# Altium schematic symbol library Altium_Lib.SchLib: 403 symbols (part 1 of 4) (continued)
## BT832A (continued)

## BT832X
designator U?
Bluetooth Modules (802.15.1) nRF52832 1170 Meters Bluetooth 5 Module; Manufacturer: Fanstel; Antenna: Integrated Trace; Data Rate: 1 Mb/s; Frequency: 2.4 GHz; Memory Size: 64 kB, 512 kB; Output Power: 20 dBm; Range: 1170 m; Sensitivity: - 96 dBm; Shielding: Shielded; Interface Type: I2C, SPI, UART; Class: Bluetooth Low Energy (BLE); Core: ARM Cortex M4F; Operating Supply Voltage: 1.8 V to 3.6 V; Protocol: Bluetooth 5.0; Product Status: New Product; Supplier 1: Mouser; Manufacturer Part Number: BT832X; RoHS: RoHS Compliant; Category: Bluetooth Modules (802.15.1); Stock 1: 2795; Pricing 1: 1=18.95, 10=17.50, 25=16.04, 50=15.55, 100=14.82, 250=14.09, 500=13.12, 1000=12.04 (USD); Dimensions: 15 mm x 28 mm x 1.9 mm; Height: 1.9 mm; Length: 15 mm; Packaging: Cut Tape; Series: BT832; Width: 28 mm; Brand: Fanstel; Mounting Style: SMD/SMT; Maximum Operating Temperature: + 85 C; Minimum Operating Temperature: - 40 C; Moisture Sensitive: Yes; Product Type: Bluetooth Modules; Standard Pack Qty: 1000; Subcategory: Wireless & RF Modules; Version: Bluetooth 5.0; RoHS - Mouser: Y; Minimum Order Quantity: 1; Reeling: True; ComponentLink1URL: https://www.mouser.com/datasheet/2/915/BlueNor_BT832X_datasheets-1518727.pdf; ComponentLink1Description: https://www.mouser.com/datasheet/2/915/BlueNor_BT832X_datasheets-1518727.pdf; Supplier Part Number 1: 308-BT832X
footprint BT832X
pins: 1 P26/SDA, 2 P27/SCL, 3 P00/XL1, 4 P01/XL2, 5 P02/AIN0, 6 P03/AIN1, 7 P09, 8 P10, 9 VDD, 10 GND, 11 P13, 12 P18, 13 P20, 14 P21/RESET, 15 SWCLK, 16 SWDIO, PA0 A0/VSS1, PA1 A1/P28, PA2 A2/P29, PA3 A3/P04, PA4 A4/P05, PA5 A5/P07, PB0 B0/VSS2, PB1 B1/P25, PB2 B2/P30, PB3 B3/P31, PB4 B4/P06, PB5 B5/P08, PC0 C0/VSS3, PC1 C1/P24, PC2 C2/P22, PC3 C3/P17, PC4 C4/P15, PC5 C5/P12, PD0 D0/VSS4, PD1 D1/P23, PD2 D2/P19, PD3 D3/P16, PD4 D4/P14, PD5 D5/P11

## BUZZER__AI-1223-TWT-3V-2-R
designator B?, comment AI-1223-TWT-3V-2-R
AUDIO MAGNETIC INDICATOR 2-4V TH; Manufacturer: Projects Unlimited; Frequency: 2.3kHz; Operating Supply Current: 30mA; Voltage Rating: 3V; Min Supply Voltage (DC): 2V; Max Supply Voltage (DC): 4V; Supplier 1: Avnet; Manufacturer Part Number: AI-1223-TWT-3V-2-R; Stock 1: 91; Pricing 1: 100=1.1068, 110=1.0317, 210=0.9462, 500=0.9177, 1000=0.8721, 5000=0.8493, 10000=0.7242 (USD); Mount: Through Hole; Contact Plating: Tin; Min Operating Temperature: -20°C; Max Operating Temperature: 70°C; Packaging: Tray; Termination: PC Pins; Max Supply Current: 30mA; Nominal Supply Voltage (DC): 3V; Sensing Method: Magnetic; Diameter: 12mm; Height: 7.5mm; Supplier Part Number 1: AI-1223-TWT-3V-2-R
footprint Buzzer_1
pins: 1 +, 2 -

## BUZZER__CMT-7525-80-SMT-TR
designator B?, comment CMT-7525-80-SMT-TR
BUZZER MAGN 3.6V 7.5X7.5MM SMD; Manufacturer: CUI; Supplier 1: Future Electronics; Manufacturer Part Number: CMT-7525-80-SMT-TR; Stock 1: 0; Pricing 1: 2000=0.865 (USD); Supplier Part Number 1: 4134657
footprint BUZZER_SMD__CMT-8540S-SMT-TR
pins: 1 +, 2 -

## BUZZER__CMT-8540S-SMT-TR
designator B?, comment CMT-8540S-SMT-TR
AUDIO MAGNETIC XDCR 1-6V SMD; Manufacturer: CUI Inc.; Port Location: Top; Voltage Range: 1 ~ 6V; Driver Circuitry: Transducer, Externally Driven; Frequency: 4kHz; Input Type: Zero-Peak Signal; Operating Mode: Single Tone; Sound Pressure Level (SPL): 100dB @ 5V, 10cm; Current - Supply: 150mA; Technology: Magnetic; Manufacturer Part Number: CMT-8540S-SMT-TR; RoHS: RoHS Compliant; Height - Seated (Max): 0.165" (4.20mm); Supplier: Digi-Key; Duration: -; Mounting Type: Surface Mount; Part Status: Active; Packaging: Tape & Reel (TR); Operating Temperature: -20°C ~ 70°C; Approvals: -; Category: Audio Products; Size / Dimension: 0.335" L x 0.335" W (8.50mm x 8.50mm); Ratings: -; Termination: Solder Pads; ComponentLink1URL: https://www.cui.com/product/resource/digikeypdf/cmt-8540s-smt.pdf; ComponentLink1Description: https://www.cui.com/product/resource/digikeypdf/cmt-8540s-smt.pdf; Pricing: 1000=1.9152, 3000=1.872 (USD); Supplier Part Number: 102-3746-2-ND
footprint BUZZER_SMD__CMT-8540S-SMT-TR
pins: 1 +, 2 -

## BUZZER__MCW12075-5V-2300-F
designator B?, comment MCW12075-5V-2300-F
AUDIO MAGNETIC INDICATOR 4-7V TH; Manufacturer: SUNWAY; Voltage Range: 3V - 7V; Current - Supply: 30mA; Sound Pressure Level (SPL): 85dB @ 10cm; Manufacturer Part Number: MCW12075-5V-2300-F; Technology: Magnetic
footprint Buzzer_1
pins: 1 +, 2 -

## BUZZER__ST-0503
designator LS?, comment ST-0503
5 mm, 3 V, 75 dB, Surface Mount _SMT_, Magnetic Audio Transducer Buzzer; Manufacturer: Soberton Inc.; Port Location: Top; Current - Supply: 110mA; Driver Circuitry: Transducer, Externally Driven; Input Type: Zero-Peak Signal; Voltage Range: 2 ~ 4V; Frequency: 4kHz; Operating Mode: Single Tone; Sound Pressure Level (SPL): 80dB @ 3V, 10cm; Operating Temperature: -40°C ~ 85°C; Mounting Type: Surface Mount; Ratings: -; Termination: Solder Pads; Manufacturer Part Number: ST-0503; Approvals: -; Category: Audio Products; Supplier: Digi-Key; RoHS: RoHS Compliant; Packaging: Tape & Reel (TR); Part Status: Active; Technology: Magnetic; Duration: -; Height - Seated (Max): 0.114" (2.90mm); Size / Dimension: 0.197" L x 0.197" W (5.00mm x 5.00mm); ComponentLink1URL: https://media.digikey.com/pdf/Data%20Sheets/Soberton%20PDFs/ST-0503.pdf; ComponentLink1Description: https://media.digikey.com/pdf/Data%20Sheets/Soberton%20PDFs/ST-0503.pdf; Pricing: 2500=1.08185 (GBP); Supplier Part Number: 433-1083-2-ND
footprint ST-0503
pins: 1 P, 2 N
text: +

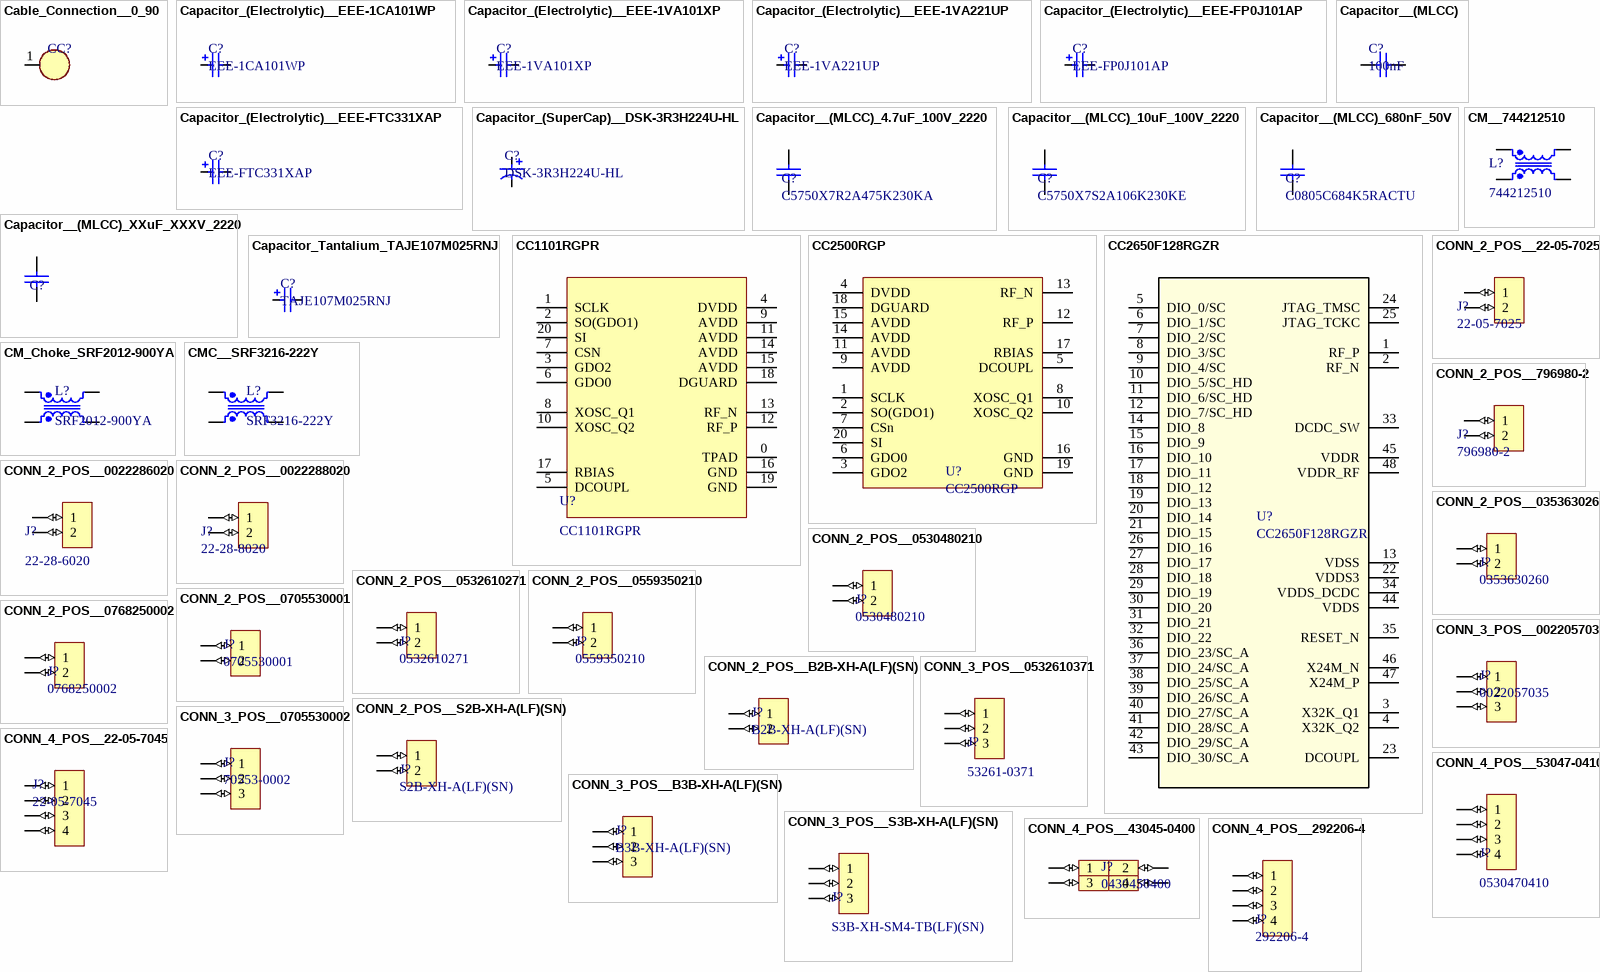
[diagram p1: symbols Cable_Connection__0_90 to CONN_4_POS__292206-4]

## Cable_Connection__0_90
designator CC?  (no BOM)
Cable Connection part
footprint Cable_Connection (0.9X1.8) ((H_0.90mmX D1.80mm)))
pins: 1 (power)

## Capacitor_(Electrolytic)__EEE-1CA101WP
designator C?, comment EEE-1CA101WP
CAP ALUM 100UF 20% 16V SMD; Manufacturer: Panasonic Electronic Components; Ripple Current - High Frequency: 119mA @ 10kHz; Lifetime @ Temp.: 1000 Hrs @ 85°C; Surface Mount Land Size: 0.260" L x 0.260" W (6.60mm x 6.60mm); Capacitance: 100µF; Ripple Current - Low Frequency: 70mA @ 120Hz; Polarization: Polar; Impedance: -; Mounting Type: Surface Mount; Part Status: Active; ESR (Equivalent Series Resistance): -; Package / Case: Radial, Can - SMD; Category: Capacitors; Lead Spacing: -; Applications: General Purpose; Voltage Rating: 16V; Tolerance: ±20%; Size / Dimension: 0.248" Dia (6.30mm); RoHS: RoHS Compliant; Packaging: Cut Tape (CT); Manufacturer Part Number: EEE-1CA101WP; Height - Seated (Max): 0.213" (5.40mm); Supplier: Digi-Key; Operating Temperature: -40°C ~ 85°C; ComponentLink1URL: https://industrial.panasonic.com/cdbs/www-data/pdf/RDE0000/ABA0000C1145.pdf; ComponentLink1Description: https://industrial.panasonic.com/cdbs/www-data/pdf/RDE0000/ABA0000C1145.pdf; Pricing: 1=0.38, 10=0.263, 100=0.1579, 500=0.11846 (USD); Supplier Part Number: PCE3880CT-ND
footprint AE_C_R6
pins: 1, 2

## Capacitor_(Electrolytic)__EEE-1VA101XP
designator C?, comment EEE-1VA101XP
CAP ALUM 100UF 20% 35V SMD; Manufacturer: Panasonic Electronic Components; Capacitance: 100µF; Ripple Current: 132mA @ 120Hz; Polarization: Polar; Lifetime @ Temp.: 2000 Hrs @ 85°C; Surface Mount Land Size: 0.260" L x 0.260" W (6.60mm x 6.60mm); Package / Case: Radial, Can - SMD; Mounting Type: Surface Mount; Manufacturer Part Number: EEE-1VA101XP; Voltage Rating: 35V; Operating Temperature: -40°C ~ 85°C; Packaging: Tape & Reel (TR); Height - Seated (Max): 0.303" (7.70mm); Supplier: Digi-Key; Applications: General Purpose; RoHS: RoHS Compliant; Tolerance: ±20%; Impedance: -; Lead Spacing: -; Size / Dimension: 0.248" Dia (6.30mm); ESR (Equivalent Series Resistance): -; Category: Capacitors; Part Status: Active; ComponentLink1URL: https://industrial.panasonic.com/cdbs/www-data/pdf/RDE0000/ABA0000C1145.pdf; ComponentLink1Description: https://industrial.panasonic.com/cdbs/www-data/pdf/RDE0000/ABA0000C1145.pdf; Pricing: 900=0.1006, 1800=0.09557, 2700=0.09054, 4500=0.08551, 9000=0.08048, 22500=0.07796, 45000=0.07545, 90000=0.07042 (USD); Stock: 45900; Supplier Part Number: PCE3951TR-ND
footprint AE_C_R6
pins: 1, 2

## Capacitor_(Electrolytic)__EEE-1VA221UP
designator C?, comment EEE-1VA221UP
CAP ALUM 220UF 20% 35V SMD; Manufacturer: Panasonic Electronic Components; Capacitance: 220µF; Lifetime @ Temp.: 2000 Hrs @ 85°C; Polarization: Polar; Surface Mount Land Size: 0.327" L x 0.327" W (8.30mm x 8.30mm); Ripple Current: 200mA @ 120Hz; Size / Dimension: 0.315" Dia (8.00mm); Packaging: Cut Tape (CT); Manufacturer Part Number: EEE-1VA221UP; RoHS: RoHS Compliant; ESR (Equivalent Series Resistance): -; Supplier: Digi-Key; Part Status: Active; Tolerance: ±20%; Operating Temperature: -40°C ~ 85°C; Impedance: -; Lead Spacing: -; Height - Seated (Max): 0.402" (10.20mm); Category: Capacitors; Voltage Rating: 35V; Package / Case: Radial, Can - SMD; Mounting Type: Surface Mount; Applications: General Purpose; ComponentLink1URL: https://industrial.panasonic.com/cdbs/www-data/pdf/RDE0000/ABA0000C1145.pdf; ComponentLink1Description: https://industrial.panasonic.com/cdbs/www-data/pdf/RDE0000/ABA0000C1145.pdf; Pricing: 1=0.57, 10=0.4, 25=0.3416, 50=0.3026, 100=0.2636, 250=0.22456 (USD); Stock: 92305; Supplier Part Number: PCE3955CT-ND
footprint AE_C_R8
pins: 1, 2

## Capacitor_(Electrolytic)__EEE-FP0J101AP
designator C?, comment EEE-FP0J101AP
CAP ALUM 100UF 20% 6.3V SMD; Manufacturer: Panasonic Electronic Components; Ripple Current - High Frequency: 300mA @ 100kHz; Lifetime @ Temp.: 2000 Hrs @ 105°C; Polarization: Polar; ESR (Equivalent Series Resistance): 260 mOhm @ 100kHz; Ripple Current - Low Frequency: 195mA @ 120Hz; Surface Mount Land Size: 0.260" L x 0.260" W (6.60mm x 6.60mm); Capacitance: 100µF; RoHS: RoHS Compliant; Lead Spacing: -; Applications: Automotive; Package / Case: Radial, Can - SMD; Part Status: Active; Manufacturer Part Number: EEE-FP0J101AP; Category: Capacitors; Supplier: Digi-Key; Packaging: Tape & Reel (TR); Height - Seated (Max): 0.228" (5.80mm); Tolerance: ±20%; Size / Dimension: 0.248" Dia (6.30mm); Mounting Type: Surface Mount; Operating Temperature: -55°C ~ 105°C; ComponentLink1URL: http://industrial.panasonic.com/www-cgi/jvcr13pz.cgi?E+PZ+3+ABA0114+EEEFP0J101AP+7+WW; ComponentLink1Description: http://industrial.panasonic.com/www-cgi/jvcr13pz.cgi?E+PZ+3+ABA0114+EEEFP0J101AP+7+WW; Pricing: 1000=0.14298, 2000=0.13457, 5000=0.12616, 10000=0.11775, 25000=0.11354, 50000=0.10934 (USD); Stock: 3000; Supplier Part Number: PCE4513TR-ND; Voltage Rating: 6.3V
footprint AE_C_R6
pins: 1, 2

## Capacitor_(Electrolytic)__EEE-FTC331XAP
designator C?, comment EEE-FTC331XAP
CAP ALUM 330UF 20% 16V SMD; Manufacturer: Panasonic Electronic Components; Surface Mount Land Size: 0.260" L x 0.260" W (6.60mm x 6.60mm); ESR (Equivalent Series Resistance): 160 mohm @ 100kHz; Polarization: Polar; Lifetime @ Temp.: 2000 Hrs @ 105°C; Capacitance: 330µF; Size / Dimension: 0.248" Dia (6.30mm); Package / Case: Radial, Can - SMD; Lead Spacing: -; Applications: Automotive; Mounting Type: Surface Mount; Ratings: AEC-Q200; Height - Seated (Max): 0.315" (8.00mm); Category: Capacitors; Supplier: Digi-Key; Packaging: Cut Tape (CT); Part Status: Active; RoHS: RoHS Compliant; Operating Temperature: -55°C ~ 105°C; Tolerance: ±20%; Manufacturer Part Number: EEE-FTC331XAP; ComponentLink1URL: https://industrial.panasonic.com/cdbs/www-data/pdf/RDE0000/ABA0000C1240.pdf; ComponentLink1Description: https://industrial.panasonic.com/cdbs/www-data/pdf/RDE0000/ABA0000C1240.pdf; Pricing: 1=0.8, 10=0.591, 100=0.4051 (USD); Supplier Part Number: P15095CT-ND
footprint CAP_6.60mmX6.60mm__8.00mm
pins: 1, 2

## Capacitor_(SuperCap)__DSK-3R3H224U-HL
designator C?, comment DSK-3R3H224U-HL
CAP 220MF -20% +80% 3.3V SMD; Manufacturer: Elna America; Lifetime @ Temp.: 1000 Hrs @ 60°C; ESR (Equivalent Series Resistance): 200 Ohm; Tolerance: -20%, +80%; Manufacturer Part Number: DSK-3R3H224U-HL; Category: Capacitors; Package / Case: Coin, Wide Terminals - Opposite Sides; Operating Temperature: -10°C ~ 60°C; Lead Spacing: -; Height - Seated (Max): 0.118" (3.00mm); Termination: SMD (SMT) Tabs; Supplier: Digi-Key; Mounting Type: Surface Mount; Size / Dimension: 0.268" Dia (6.80mm); Part Status: Active; Packaging: Tape & Reel (TR); RoHS: RoHS Compliant; ComponentLink1URL: https://media.digikey.com/pdf/Data%20Sheets/Elna%20America%20Inc/DS,DSK.pdf; ComponentLink1Description: https://media.digikey.com/pdf/Data%20Sheets/Elna%20America%20Inc/DS,DSK.pdf; Pricing: 1500=0.64815, 3000=0.60494, 4500=0.58334, 10500=0.56173, 15000=0.55093 (USD); Supplier Part Number: 604-1020-2-ND
footprint SuperCAp
pins: 1, 2

## Capacitor__(MLCC)
designator C?, comment 100nF
Manufacturer Part Number: 100nF; Category: Capacitors
footprint C-0402 (Chip Capacitor; Body 1.0 x 0.5 mm (LxW typ))
footprint C-0603 (Chip Capacitor; Body 1.6 x 0.8 mm (LxW typ))
footprint C-0805 (Chip Resistor; Body 2.0 x 1.3 mm (LxW typ))
footprint C-1206 (Chip Resistor; Body 3.2 x 1.6 mm (LxW typ))
footprint C-1210 (Chip Resistor; Body 3.2 x 2.5 mm (LxW typ))
pins: 1, 2

## Capacitor__(MLCC)_4.7uF_100V_2220
designator C?, comment C5750X7R2A475K230KA
CAP CER 4.7UF 100V X7R 2220; Manufacturer: TDK Corporation; Tolerance: ±10%; Notification: Current market demand for these product types have resulted in fluctuating and extending lead times. Lead times may differ.; Capacitance: 4.7µF; RoHS: RoHS Compliant; Manufacturer Part Number: C5750X7R2A475K230KA; Supplier: Digi-Key; Category: Capacitors; Height - Seated (Max): -; Operating Temperature: -55°C ~ 125°C; Thickness (Max): 0.098" (2.50mm); Lead Spacing: -; Temperature Coefficient: X7R; Size / Dimension: 0.224" L x 0.197" W (5.70mm x 5.00mm); Lead Style: -; Failure Rate: -; Mounting Type: Surface Mount, MLCC; Packaging: Cut Tape (CT); Ratings: -; Applications: General Purpose; Part Status: Active; Package / Case: 2220 (5750 Metric); Voltage - Rated: 100V; Features: -; ComponentLink1URL: https://product.tdk.com/info/en/catalog/datasheets/mlcc_commercial_midvoltage_en.pdf; ComponentLink1Description: https://product.tdk.com/info/en/catalog/datasheets/mlcc_commercial_midvoltage_en.pdf; Pricing: 1=2.93, 10=2.372, 100=1.8113 (USD); Supplier Part Number: 445-4526-1-ND
footprint CAPC2220(5750)165_M
pins: 1, 2

## Capacitor__(MLCC)_10uF_100V_2220
designator C?, comment C5750X7S2A106K230KE
CAP CER 10UF 100V X7S 2220; Manufacturer: TDK Corporation; Tolerance: ±10%; Capacitance: 10µF; Supplier 1: Digi-Key; Manufacturer Part Number: C5750X7S2A106K230KE; RoHS: RoHS Compliant; Category: Capacitors; Stock 1: 5000; Pricing 1: 1=3.85, 10=3.105, 100=2.4219 (USD); Packaging: Cut Tape (CT); Part Status: Active; Voltage - Rated: 100V; Temperature Coefficient: X7S; Operating Temperature: -55°C ~ 125°C; Features: Soft Termination; Ratings: -; Applications: Boardflex Sensitive; Failure Rate: -; Mounting Type: Surface Mount, MLCC; Package / Case: 2220 (5750 Metric); Size / Dimension: 0.224" L x 0.197" W (5.70mm x 5.00mm); Height - Seated (Max): -; Thickness (Max): 0.110" (2.80mm); Lead Spacing: -; Lead Style: -; ComponentLink1URL: https://product.tdk.com/info/en/catalog/datasheets/mlcc_commercial_soft_en.pdf; ComponentLink1Description: https://product.tdk.com/info/en/catalog/datasheets/mlcc_commercial_soft_en.pdf; Supplier Part Number 1: 445-8871-1-ND
footprint CAPC2220(5750)165_M
pins: 1, 2

## Capacitor__(MLCC)_680nF_50V
designator C?, comment C0805C684K5RACTU
CAP CER 0.68UF 50V X7R 0805; Manufacturer: KEMET; Notification: Current market demand for these product types have resulted in fluctuating and extending lead times. Lead times may differ.; Tolerance: ±10%; Capacitance: 0.68µF; Supplier: Digi-Key; Category: Capacitors; Ratings: -; Manufacturer Part Number: C0805C684K5RACTU; Operating Temperature: -55°C ~ 125°C; Lead Spacing: -; Lead Style: -; Part Status: Active; Mounting Type: Surface Mount, MLCC; Size / Dimension: 0.079" L x 0.049" W (2.00mm x 1.25mm); Package / Case: 0805 (2012 Metric); Thickness (Max): 0.057" (1.45mm); Temperature Coefficient: X7R; Applications: General Purpose; Features: Low ESL; RoHS: RoHS Compliant; Packaging: Cut Tape (CT); Failure Rate: -; Height - Seated (Max): -; Voltage - Rated: 50V; ComponentLink1URL: https://api.kemet.com/component-edge/download/datasheet/C0805C684K5RACTU.pdf; ComponentLink1Description: https://api.kemet.com/component-edge/download/datasheet/C0805C684K5RACTU.pdf; Pricing: 1=0.42, 10=0.29, 100=0.1642, 500=0.11592, 1000=0.10143 (USD); Supplier Part Number: 399-8114-1-ND
footprint C-0805 (Chip Resistor; Body 2.0 x 1.3 mm (LxW typ))
pins: 1, 2

## Capacitor__(MLCC)_XXuF_XXXV_2220
designator C?
Not mounted (only Footprint); Manufacturer: TDK Corporation
footprint CAPC2220(5750)165_M
pins: 1, 2

## Capacitor_Tantalium_TAJE107M025RNJ
designator C?, comment TAJE107M025RNJ
CAP TANT 100UF 25V 20% 2917; Manufacturer: AVX Corporation; Manufacturer Size Code: E; Capacitance: 100µF; ESR (Equivalent Series Resistance): 300 mOhm; Type: Molded; Category: Capacitors; Failure Rate: -; Features: General Purpose; Height - Seated (Max): 0.169" (4.30mm); Lead Spacing: -; Lifetime @ Temp.: -; Manufacturer Part Number: TAJE107M025RNJ; Mounting Type: Surface Mount; Operating Temperature: -55°C ~ 125°C; Package / Case: 2917 (7343 Metric); Packaging: Tape & Reel (TR); Part Status: Active; RoHS: RoHS Compliant; Size / Dimension: 0.287" L x 0.169" W (7.30mm x 4.30mm); Supplier: Digi-Key; Tolerance: ±20%; Voltage - Rated: 25V; ComponentLink1URL: http://datasheets.avx.com/TAJ.pdf; ComponentLink1Description: http://datasheets.avx.com/TAJ.pdf; Pricing: 400=2.3625, 800=2.12625, 1200=2.09475 (USD); Supplier Part Number: 478-5531-2-ND
footprint CAP_TANTALIUM_7343 (7.43mm X 4.43mm)
pins: 1, 2

## CC1101RGPR
designator U?
IC RF TXRX ISM<1GHZ 20VFQFN; Manufacturer: Texas Instruments; Min Supply Voltage: 1.8V; Max Supply Voltage: 3.6V; Data Rate: 600Kbps; Frequency: 915MHz; Interface: SPI; Number of Receivers: 1; Sensitivity: -116dBm; Density: 0B; Current - Receiving: 17.1mA; Current - Transmitting: 34.2mA; Max Frequency: 928MHz; Supplier 1: Digi-Key; Manufacturer Part Number: CC1101RGPR; Stock 1: 13117; Pricing 1: 1=4.07, 10=3.635, 25=3.2716, 100=2.9807, 250=2.6899, 500=2.4136, 1000=2.0356 (USD); Mount: Surface Mount; Case/Package: VQFN; Number of Pins: 20; Weight: 0.002469oz; Contact Plating: Gold; Min Operating Temperature: -40°C; Max Operating Temperature: 85°C; Packaging: Tape and Reel; Package Quantity: 3000; Number of Transmitters: 1; Length: 4.15mm; Depth: 4.15mm; REACH SVHC: No SVHC; Lead Free: Lead Free; ComponentLink1URL: http://www.ti.com/lit/pdf/swrz020?src-supplier=Digi-Key; ComponentLink1Description: http://www.ti.com/lit/pdf/swrz020?src-supplier=Digi-Key; Supplier Part Number 1: 296-35718-1-ND
footprint VFQFN-20_Exposed_Pad
pins: 0 TPAD, 1 SCLK, 2 SO(GDO1), 3 GDO2, 4 DVDD, 5 DCOUPL, 6 GDO0, 7 CSN, 8 XOSC_Q1, 9 AVDD, 10 XOSC_Q2, 11 AVDD, 12 RF_P, 13 RF_N, 14 AVDD, 15 AVDD, 16 GND, 17 RBIAS, 18 DGUARD, 19 GND, 20 SI

## CC2500RGP
designator U?
IC RF TXRX ISM>1GHZ 20-VFQFN; Manufacturer: Texas Instruments; RF Family/Standard: General ISM > 1GHZ; Modulation: 2FSK, GFSK, MSK, OOK; Frequency: 2.4GHz; Data Rate (Max): 500kBaud; Power - Output: 1dBm; Sensitivity: -104dBm; Serial Interfaces: SPI; Voltage - Supply: 1.8 V ~ 3.6 V; Current - Receiving: 13.3mA ~ 19.6mA; Current - Transmitting: 11.1mA ~ 21.5mA; Manufacturer Part Number: CC2500RGP; Category: RF/IF and RFID; Supplier: Digi-Key; RoHS: RoHS Compliant; Packaging: Tray; Part Status: Active; Type: TxRx Only; Protocol: -; Memory Size: -; Operating Temperature: -40°C ~ 85°C; Package / Case: 20-VFQFN Exposed Pad; ComponentLink1URL: http://www.ti.com/lit/ds/symlink/cc2500.pdf; ComponentLink1Description: http://www.ti.com/lit/ds/symlink/cc2500.pdf; Pricing: 1=3.33, 10=2.97, 25=2.6732, 100=2.4354, 250=2.1978, 500=1.97208, 1000=1.6632 (USD); Supplier Part Number: 296-19468-ND
footprint VFQFN-20_Exposed_Pad
pins: 1 SCLK, 2 SO(GDO1), 3 GDO2, 4 DVDD, 5 DCOUPL, 6 GDO0, 7 CSn, 8 XOSC_Q1, 9 AVDD, 10 XOSC_Q2, 11 AVDD, 12 RF_P, 13 RF_N, 14 AVDD, 15 AVDD, 16 GND, 17 RBIAS, 18 DGUARD, 19 GND, 20 SI

## CC2650F128RGZR
designator U?
IC RF TXRX+MCU 802.15.4/BT 48QFN; Manufacturer: Texas Instruments; RF Family/Standard: 802.15.4, Bluetooth; Protocol: 6LoWPAN, Bluetooth v4.1, Zigbee®; Data Rate (Max): 1Mbps; Power - Output: 5dBm; Sensitivity: -100dBm; Modulation: DSSS, O-QPSK, GFSK; Frequency: 2.4GHz; Memory Size: 128kB Flash, 28kB SRAM; Serial Interfaces: I²C, I²S, JTAG, SPI, UART; Voltage - Supply: 1.8 V ~ 3.8 V; Current - Receiving: 5.9mA ~ 6.1mA; Current - Transmitting: 6.1mA ~ 9.1mA; Manufacturer Part Number: CC2650F128RGZR; Category: RF/IF and RFID; Supplier: Digi-Key; RoHS: RoHS Compliant; Packaging: Tape & Reel (TR); Part Status: Active; Type: TxRx + MCU; Operating Temperature: -40°C ~ 85°C; Package / Case: 48-VFQFN Exposed Pad; ComponentLink1URL: http://www.ti.com/lit/ds/symlink/cc2650.pdf; ComponentLink1Description: http://www.ti.com/lit/ds/symlink/cc2650.pdf; Pricing: 2500=3.10156 (USD); Supplier Part Number: 296-44316-2-ND
footprint QFN48-(7mmX7mm) (QFN, 48-Leads, Body 7,1x7,1mm (max), Pitch 0,50mm, IPC Medium Density)
pins: 0 EGP hidden to GND, 1 RF_P, 2 RF_N, 3 X32K_Q1, 4 X32K_Q2, 5 DIO_0/SC, 6 DIO_1/SC, 7 DIO_2/SC, 8 DIO_3/SC, 9 DIO_4/SC, 10 DIO_5/SC_HD, 11 DIO_6/SC_HD, 12 DIO_7/SC_HD, 13 VDSS, 14 DIO_8, 15 DIO_9, 16 DIO_10, 17 DIO_11, 18 DIO_12, 19 DIO_13, 20 DIO_14, 21 DIO_15, 22 VDDS3, 23 DCOUPL, 24 JTAG_TMSC, 25 JTAG_TCKC, 26 DIO_16, 27 DIO_17, 28 DIO_18, 29 DIO_19, 30 DIO_20, 31 DIO_21, 32 DIO_22, 33 DCDC_SW, 34 VDDS_DCDC, 35 RESET_N, 36 DIO_23/SC_A, 37 DIO_24/SC_A, 38 DIO_25/SC_A, 39 DIO_26/SC_A, 40 DIO_27/SC_A, 41 DIO_28/SC_A, 42 DIO_29/SC_A, 43 DIO_30/SC_A, 44 VDDS, 45 VDDR, 46 X24M_N, 47 X24M_P, 48 VDDR_RF

## CM__744212510
designator L?, comment 744212510
Common Mode Filters / Chokes WE-SL1 SMD Ln Filter 2x51uH 300ohm; Manufacturer: Wurth Electronics; Core Material: Ferrite; Inductance: 51uH; Number of Lines: 2; DC Resistance (DCR): 160mR; Current Rating: 300mA; Test Frequency: 100kHz; Inductance Tolerance: 50%; Voltage Rating (DC): 80V; Impedance: 300R; Supplier 1: Digi-Key; Manufacturer Part Number: 744212510; RoHS: Yes; Category: Fixed Inductors; Pricing 1: 1=4,37000, 10=4,31200, 50=3,89500, 100=3,75600, 500=3,47800 (USD); Mount: Surface Mount; Case/Package: SMD/SMT; Number of Pins: 4; Min Operating Temperature: -40°C; Max Operating Temperature: 105°C; Package Quantity: 1000; Packaging: Tape and Reel; Current: 300mA; Max DC Current: 300mA; Termination: SMD/SMT; Series: WE-SL1; Tolerance: 50%; Length: 6.5mm; Width: 0.142inch; Height: 1.65mm; Depth: 3.6mm; REACH SVHC: No SVHC; Lead Free: Lead Free; RoHS Compliant: Yes; ComponentLink1URL: https://datasheet.ciiva.com/11800/0900766b8059564e-11800467.pdf?src-supplier=RSComponents; ComponentLink1Description: https://datasheet.ciiva.com/11800/0900766b8059564e-11800467.pdf?src-supplier=RSComponents; ComponentLink2URL: https://datasheet.ciiva.com/6048/1735560-6048484.pdf?src-supplier=Farnell; ComponentLink2Description: https://datasheet.ciiva.com/6048/1735560-6048484.pdf?src-supplier=Farnell; ComponentLink3URL: https://datasheet.ciiva.com/1130/744212510-1130407.pdf?src-supplier=Newark; ComponentLink3Description: https://datasheet.ciiva.com/1130/744212510-1130407.pdf?src-supplier=Newark; ComponentLink4URL: https://datasheet.ciiva.com/4952/744212510-77598-4952687.pdf?src-supplier=Mouser; ComponentLink4Description: https://datasheet.ciiva.com/4952/744212510-77598-4952687.pdf?src-supplier=Mouser; ComponentLink5URL: https://datasheet.ciiva.com/7764/1735560-7764951.pdf?src-supplier=Element14; ComponentLink5Description: https://datasheet.ciiva.com/7764/1735560-7764951.pdf?src-supplier=Element14; ComponentLink6URL: https://datasheet.ciiva.com/6216/744212510-6216346.pdf?src-supplier=Digi-Key; ComponentLink6Description: https://datasheet.ciiva.com/6216/744212510-6216346.pdf?src-supplier=Digi-Key; ComponentLink7URL: https://datasheet.ciiva.com/22705/1735560-22705131.pdf?src-supplier=Element14; ComponentLink7Description: https://datasheet.ciiva.com/22705/1735560-22705131.pdf?src-supplier=Element14; ComponentLink8URL: https://datasheet.ciiva.com/6216/744212510-6216348.pdf?src-supplier=Digi-Key; ComponentLink8Description: https://datasheet.ciiva.com/6216/744212510-6216348.pdf?src-supplier=Digi-Key; Supplier Part Number 1: 732-3941-6-ND
footprint CM_6.50mm x 3.60mm
pins: 1, 3, 4, 5

## CM_Choke_SRF2012-900YA
designator L?, comment SRF2012-900YA
CMC 400MA 2LN 90 OHM SMD; Manufacturer: Bourns Inc.; Voltage Rating - DC: 50V; Impedance @ Frequency: 90 Ohm @ 100MHz; DC Resistance (DCR) (Max): 300 mOhm; Number of Lines: 2; Size / Dimension: 0.079" L x 0.047" W (2.00mm x 1.20mm); Features: -; Approvals: -; Operating Temperature: -40°C ~ 125°C; Package / Case: Horizontal, 4 PC Pad; Voltage Rating - AC: -; Mounting Type: Surface Mount; Height (Max): 0.055" (1.40mm); Ratings: -; Supplier: Digi-Key; Filter Type: -; RoHS: RoHS Compliant; Packaging: Cut Tape (CT); Category: Filters; Inductance @ Frequency: -; Current Rating (Max): 400mA; Part Status: Active; Manufacturer Part Number: SRF2012-900YA; ComponentLink1URL: http://www.bourns.com/docs/Product-Datasheets/SRF2012A.pdf; ComponentLink1Description: http://www.bourns.com/docs/Product-Datasheets/SRF2012A.pdf; Pricing: 1=0.28, 10=0.251, 25=0.2196, 50=0.1882, 100=0.1725, 250=0.1568, 500=0.1474, 1000=0.1129 (USD); Supplier Part Number: SRF2012-900YACT-ND
footprint CM_0805
pins: 1, 2, 3, 4

## CMC__SRF3216-222Y
designator L?, comment SRF3216-222Y
Common Mode Chokes / Filters 2.2KOhm 30% 100MHz; Manufacturer: Bourns; Core Material: Ferrite; Impedance: 2.2 kOhms; Maximum DC Current: 200 mA; Maximum DC Resistance: 1.2 Ohms; Tolerance: 25 %; Type: Common Mode Chip Inductors; Supplier 1: Mouser; Manufacturer Part Number: SRF3216-222Y; RoHS: RoHS Compliant; Category: Common Mode Chokes / Filters; Stock 1: 16599; Pricing 1: 1=0.700, 10=0.612, 100=0.437, 250=0.410, 500=0.367, 1000=0.297, 2000=0.258, 4000=0.243, 10000=0.228 (USD); Height: 2 mm; Length: 3.2 mm; Package / Case: 3216; Packaging: Cut Tape; Product: Common Mode Line Filters; Series: SRF3216; Termination Style: SMD/SMT; Width: 1.6 mm; Brand: Bourns; Mounting Style: SMD/SMT; Maximum Operating Temperature: + 125 C; Minimum Operating Temperature: - 55 C; Product Type: Common Mode Chokes; Standard Pack Qty: 2000; Subcategory: Inductors, Chokes & Coils; Test Frequency: 100 MHz; RoHS - Mouser: Y; Minimum Order Quantity: 1; Reeling: True; ComponentLink1URL: https://www.mouser.com/datasheet/2/54/rf3216-1391379.pdf; ComponentLink1Description: https://www.mouser.com/datasheet/2/54/rf3216-1391379.pdf; Supplier Part Number 1: 652-SRF3216-222Y
footprint CM_1206
pins: 1, 2, 3, 4

## CONN_2_POS__22-05-7025
designator J?, comment 22-05-7025
CONN HEADER 2POS 2.5MM R/A TIN; Manufacturer: Molex Connector Corporation; Material Flammability Rating: UL94 V-0; Pitch - Mating: 0.098" (2.50mm); Style: Board to Cable/Wire; Number of Positions Loaded: All; Contact Length - Mating: 0.138" (3.50mm); Shrouding: Shrouded - 4 Wall; Number of Positions: 2; Ingress Protection: -; Insulation Material: Polyamide (PA66), Nylon 6/6, Glass Filled; Operating Temperature: -; Features: -; Applications: Automotive, General Purpose, Industrial, Medical, Telecommunications; Mated Stacking Heights: -; Insulation Color: Natural; Contact Finish Thickness - Post: 160.0µin (4.06µm); Voltage Rating: -; Current Rating: -; Contact Finish - Post: Tin; Mounting Type: Through Hole, Right Angle; Contact Type: Male Pin; RoHS: RoHS Compliant; Contact Shape: Circular; Contact Material: Brass; Number of Rows: 1; Manufacturer Part Number: 22-05-7025; Contact Finish Thickness - Mating: 160.0µin (4.06µm); Connector Type: Header; Supplier: Digi-Key; Fastening Type: Detent Lock; Part Status: Active; Overall Contact Length: -; Packaging: Bulk; Row Spacing - Mating: -; Insulation Height: 0.193" (4.90mm); Contact Length - Post: 0.138" (3.50mm); Termination: Solder; Contact Finish - Mating: Tin; Category: Connectors, Interconnects; ComponentLink1URL: https://www.molex.com/pdm_docs/sd/022057025_sd.pdf; ComponentLink1Description: https://www.molex.com/pdm_docs/sd/022057025_sd.pdf; Pricing: 1=0.63, 10=0.586, 100=0.4575, 500=0.4026, 1000=0.33855, 5000=0.30195, 10000=0.28365 (USD); Supplier Part Number: WM18900-ND
footprint CONN_2_POS__22-05-7025
pins: 1 (io), 2 (io)

## CONN_2_POS__796980-2
designator J?, comment 796980-2
TERM BLOCK HDR 2POS VERT 7.62MM; Manufacturer: TE Connectivity / AMP; Current Rating: 15 A; Mounting Angle: Vertical; Number of Positions: 2 Position; Voltage Rating: 300 VAC; Supplier 1: Mouser; Manufacturer Part Number: 796980-2; RoHS: RoHS Compliant By Exemption; Category: Pluggable Terminal Blocks; Stock 1: 281; Pricing 1: 1=0.950, 10=0.493, 100=0.407, 1000=0.365, 5000=0.286 (USD); Contact Plating: Tin; Housing Material: Polyamide (PA); Product: Headers; Termination Style: Through Hole; Brand: TE Connectivity / AMP; Contact Material: Phosphor Bronze; Flammability Rating: UL 94 V-0; Pitch: 7.62 mm; Product Type: Pluggable Terminal Blocks; Standard Pack Qty: 200; Subcategory: Terminal Blocks; RoHS - Mouser: E; Minimum Order Quantity: 1; Reeling: False; Supplier Part Number 1: 571-796980-2
footprint CONN_2_POS__796980-2
pins: 1 (io), 2 (io)

## CONN_2_POS__0022286020
designator J?, comment 22-28-6020
Headers & Wire Housings 2P RA HEADER; Manufacturer: Molex; Pitch: 2.54 mm; Current Rating: 4 A; Number of Positions: 2 Position; Mounting Angle: Right Angle; Voltage Rating: 500 V; RoHS - Mouser: Y; Minimum Order Quantity: 1; Reeling: False; Product: Headers; Packaging: Bulk; Supplier: Mouser; Type: Breakaway; Series: 42376; Mounting Style: Through Hole; Number of Rows: 1 Row; Flammability Rating: UL 94 V-0; Subcategory: Headers & Wire Housings; Category: Headers & Wire Housings; Manufacturer Part Number: 22-28-6020; Brand: Molex; RoHS: RoHS Compliant; Contact Gender: Pin (Male); Contact Plating: Tin; Standard Pack Qty: 3750; Tradename: KK; Contact Material: Tin; Termination Style: Through Hole; Row Spacing: -; Accessory Type: -; Product Type: Headers & Wire Housings; Housing Material: Thermoplastic; Contact Type: -; ComponentLink1URL: https://www.mouser.com/datasheet/2/276/0022286020_PCB_HEADERS-159082.pdf; ComponentLink1Description: https://www.mouser.com/datasheet/2/276/0022286020_PCB_HEADERS-159082.pdf; Pricing: 1=0.190, 10=0.150, 100=0.123, 500=0.107, 1000=0.087, 2500=0.077, 10000=0.070, 25000=0.069, 50000=0.064 (USD); Supplier Part Number: 538-22-28-6020
footprint CONN_2_POS__0022286020
pins: 1 (io), 2 (io)

## CONN_2_POS__0022288020
designator J?, comment 22-28-8020
Headers & Wire Housings BKWY HDR R/A 2P tin; Manufacturer: Molex; Current Rating: 4 A; Mounting Angle: Right Angle; Number of Positions: 2 Position; Voltage Rating: 500 V; Pitch: 2.54 mm; Supplier: Mouser; RoHS: RoHS Compliant; Accessory Type: -; Contact Plating: Tin; Contact Type: -; Housing Material: Thermoplastic; Manufacturer Part Number: 22-28-8020; Brand: Molex; Type: Breakaway; Mounting Style: Through Hole; Flammability Rating: UL 94 V-0; Contact Gender: Pin (Male); Row Spacing: -; Contact Material: Tin; Reeling: False; Minimum Order Quantity: 1; RoHS - Mouser: Y; Termination Style: Through Hole; Series: 42377; Category: Headers & Wire Housings; Standard Pack Qty: 3750; Tradename: KK; Number of Rows: 1 Row; Packaging: Bulk; Product: Headers; ComponentLink1URL: https://www.mouser.com/datasheet/2/276/0022288020_PCB_HEADERS-159134.pdf; ComponentLink1Description: https://www.mouser.com/datasheet/2/276/0022288020_PCB_HEADERS-159134.pdf; Pricing: 1=0.200, 10=0.156, 100=0.129, 500=0.112, 1000=0.092, 2500=0.084, 10000=0.074, 25000=0.071, 50000=0.066 (USD); Supplier Part Number: 538-22-28-8020
footprint CONN_2_POS__0022288020
pins: 1 (io), 2 (io)

## CONN_2_POS__0353630260
designator J?, comment 0353630260